# Altium footprint library Library 3D.PcbLib: 288 footprints (part 10 of 18)
Each footprint in its own frame and in the unit in brackets; x right, y up, seen from the top. Pads: shape width x height; smd on the part's side, far side on the other; paste and mask are expansions set on the pad; w line width, h text height; cw(c..) or ccw(c..) is an arc to the next point about the centre after c.
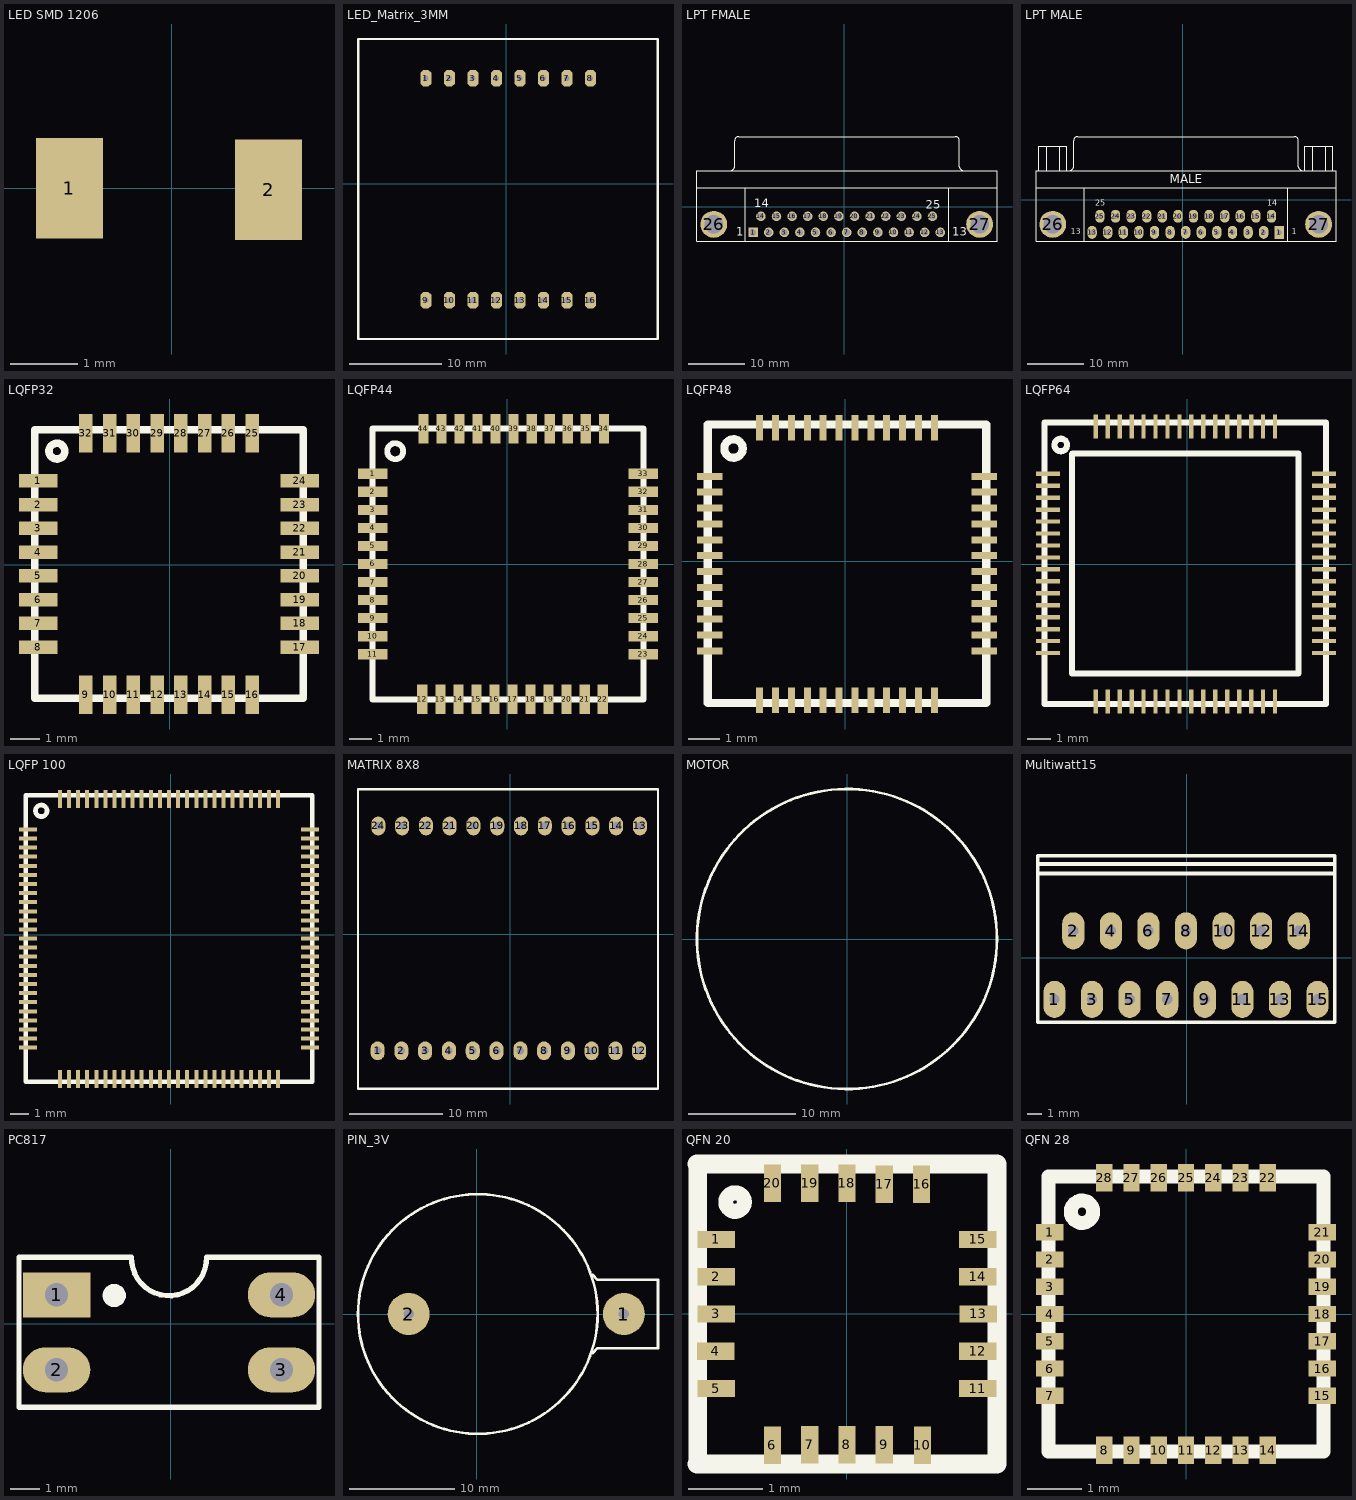
[diagram p9: the footprints below, top view; thin cyan lines are the x and y axes]

## LED SMD 1206 [mm]
pads (2):
  rect 1x1.5 smd: 1(-1.524,0) 2(1.448,-0.025)
3D body "SW3dPS-LED1206R.STEP": height 1.11, standoff -0.4, extent -1.753,-0.826 1.448,0.775

## LED_Matrix_3MM [mm]
pads (16):
  oct 1.2x1.8 hole 0.6: 1(-8.7,11.4) 2(-6.16,11.4) 3(-3.62,11.4) 4(-1.08,11.4) 5(1.46,11.4) 6(4,11.4) 7(6.54,11.4) 8(9.08,11.4) 9(-8.7,-12.6) 10(-6.16,-12.6) 11(-3.62,-12.6) 12(-1.08,-12.6) 13(1.46,-12.6) 14(4,-12.6) 15(6.54,-12.6) 16(9.08,-12.6)
Top Overlay:
  lines w0.254: -16,-16.775 -16,15.625 16.35,15.625 16.35,-16.775 -16,-16.775
3D body "Grend.STEP": height 7.2, standoff -7, extent -15.8,-16.6 16.2,15.4

## LPT FMALE [mm]
pads (27):
  rect 1.69x1.69 hole 1.09: 1(-16.091,-4.545)
  round 1.69 hole 1.09: 2(-13.33,-4.545) 3(-10.569,-4.545) 4(-7.808,-4.545) 5(-5.047,-4.545) 6(-2.286,-4.545) 7(0.475,-4.545) 8(3.236,-4.545) 9(5.997,-4.545) 10(8.758,-4.545) 11(11.519,-4.545) 12(14.28,-4.545) 13(17.041,-4.545) 14(-14.71,-1.705) 15(-11.949,-1.705) 16(-9.188,-1.705) 17(-6.427,-1.705) 18(-3.666,-1.705) 19(-0.905,-1.705) 20(1.856,-1.705) 21(4.617,-1.705) 22(7.378,-1.705) 23(10.139,-1.705) 24(12.9,-1.705) 25(15.661,-1.705)
  round 4.76 hole 3.26: 26(-23.051,-3.125) 27(24.001,-3.125)
Top Overlay:
  lines w0.2: -26.021,3.375 27.079,3.375 ; -20.066,6.38 ccw(c-20.066,7.075) -19.371,7.075 -19.371,11.675 ; -19.366,11.68 cw(c-18.671,11.68) -18.671,12.375 19.729,12.375 cw(c19.729,11.68) 20.424,11.68 ; -17.471,-6.125 -17.471,3.375 ; 18.529,-6.125 18.529,3.375 ; 20.429,11.675 20.429,7.075 ccw(c21.124,7.075) 21.124,6.38 ; -26.021,-6.125 27.079,-6.125 27.079,6.375 -26.021,6.375 -26.021,-6.125
  text "1" at -19.083,-5.182 h1.5
  text "13" at 19.144,-5.182 h1.5
  text "14" at -15.908,-0.102 h1.5
  text "25" at 14.445,-0.356 h1.5
3D body "SW3dPS-d-sub25 connector.STEP": height 12.57, standoff -4.58, extent -26.017,-6.122 27.023,14.378

## LPT MALE [mil]
pads (27):
  rect 65x90 hole 35: 1(673.86,-228.15)
  oval 65x90 hole 35: 2(565.16,-228.15) 3(456.46,-228.15) 4(347.76,-228.15) 5(239.06,-228.15) 6(130.35,-228.15) 7(21.65,-228.15) 8(-87.05,-228.15) 9(-195.75,-228.15) 10(-304.45,-228.15) 11(-413.15,-228.15) 12(-521.85,-228.15) 13(-630.55,-228.15) 14(619.51,-116.34) 15(510.81,-116.34) 16(402.11,-116.34) 17(293.41,-116.34) 18(184.7,-116.34) 19(76,-116.34) 20(-32.7,-116.34) 21(-141.4,-116.34) 22(-250.1,-116.34) 23(-358.8,-116.34) 24(-467.5,-116.34) 25(-576.2,-116.34)
  round 187.4 hole 128.35: 26(-904.57,-172.24) 27(947.87,-172.24)
Top Overlay:
  lines w7.87: -1021.5,83.66 1069.05,83.66 ; -787.05,201.97 ccw(c-787.05,229.33) -759.69,229.33 -759.69,410.43 ; -759.49,410.63 cw(c-732.13,410.63) -732.13,437.99 779.68,437.99 cw(c779.68,410.63) 807.05,410.63 ; -684.88,-290.35 -684.88,83.66 ; 732.44,-290.35 732.44,83.66 ; 807.24,410.43 807.24,229.33 ccw(c834.61,229.33) 834.61,201.97 ; -1021.5,-290.35 -1021.5,201.77 1069.05,201.77 1069.05,-290.35 -1021.5,-290.35
  lines w8: -1001.35,202.77 -1001.35,371.77 -806.35,371.77 -806.35,202.77 ; -946.35,202.77 -946.35,371.77 ; -856.35,202.77 -856.35,371.77 ; 851.65,202.77 851.65,371.77 1046.65,371.77 1046.65,202.77 ; 906.65,202.77 906.65,371.77 ; 996.65,202.77 996.65,371.77
  text "25" at -608.35,-43.23 h40
  text "14" at 591.65,-43.23 h40
  text "13" at -778.35,-243.23 h40
  text "1" at 761.65,-243.23 h40
  text "MALE" at -88.35,112.76 h60
3D body "SW3DPS-DB25RA_M-DEFAULT.STEP": height 500.6, standoff -176.56, extent -1030.9,-290.24 1074.21,434.17

## LQFP32 [mm]
pads (32):
  rect 1.3x0.45 smd: 1(-4.425,2.825) 2(-4.425,2.025) 3(-4.425,1.225) 4(-4.425,0.425) 5(-4.425,-0.375) 6(-4.425,-1.175) 7(-4.425,-1.975) 8(-4.425,-2.775) 17(4.375,-2.775) 18(4.375,-1.975) 19(4.375,-1.175) 20(4.375,-0.375) 21(4.375,0.425) 22(4.375,1.225) 23(4.375,2.025) 24(4.375,2.825)
  rect 0.45x1.3 smd: 9(-2.825,-4.375) 10(-2.025,-4.375) 11(-1.225,-4.375) 12(-0.425,-4.375) 13(0.375,-4.375) 14(1.175,-4.375) 15(1.975,-4.375) 16(2.775,-4.375) 25(2.775,4.425) 26(1.975,4.425) 27(1.175,4.425) 28(0.375,4.425) 29(-0.425,4.425) 30(-1.225,4.425) 31(-2.025,4.425) 32(-2.825,4.425)
Top Overlay:
  circle w0.254: c-3.8,3.825 r0.266
  lines w0.254: -4.544,-4.494 4.494,-4.494 4.494,4.544 -4.544,4.544 -4.544,-4.494
3D body "User Library-LQFP32-0_8.STEP": height 1.65, standoff -0.01, extent -4.569,-4.494 4.469,4.544

## LQFP44 [mm]
pads (44):
  rect 1.3x0.45 smd: 1(-5.975,4) 2(-5.975,3.2) 3(-5.975,2.4) 4(-5.975,1.6) 5(-5.975,0.8) 6(-5.975,0) 7(-5.975,-0.8) 8(-5.975,-1.6) 9(-5.975,-2.4) 10(-5.975,-3.2) 11(-5.975,-4) 23(6.025,-4) 24(6.025,-3.2) 25(6.025,-2.4) 26(6.025,-1.6) 27(6.025,-0.8) 28(6.025,0) 29(6.025,0.8) 30(6.025,1.6) 31(6.025,2.4) 32(6.025,3.2) 33(6.025,4)
  rect 0.45x1.3 smd: 12(-3.775,-6) 13(-2.975,-6) 14(-2.175,-6) 15(-1.375,-6) 16(-0.575,-6) 17(0.225,-6) 18(1.025,-6) 19(1.825,-6) 20(2.625,-6) 21(3.425,-6) 22(4.225,-6) 34(4.275,6) 35(3.475,6) 36(2.675,6) 37(1.875,6) 38(1.075,6) 39(0.275,6) 40(-0.525,6) 41(-1.325,6) 42(-2.125,6) 43(-2.925,6) 44(-3.725,6)
Top Overlay:
  circle w0.254: c-4.975,5 r0.354
  lines w0.254: -5.987,-6.012 -5.987,6.012 6.037,6.012 6.037,-6.012 -5.987,-6.012
3D body "SW3dPS-LQFP44.STEP": height 1.4, standoff 0, extent -5.987,-6.012 6.037,6.012

## LQFP48 [mm]
pads (48):
  rect 0.8x0.22 smd: 1(-4.275,2.675) 2(-4.275,2.175) 3(-4.275,1.675) 4(-4.275,1.175) 5(-4.275,0.675) 6(-4.275,0.175) 7(-4.275,-0.325) 8(-4.275,-0.825) 9(-4.275,-1.325) 10(-4.275,-1.825) 11(-4.275,-2.325) 12(-4.275,-2.825) 25(4.375,-2.825) 26(4.375,-2.325) 27(4.375,-1.825) 28(4.375,-1.325) 29(4.375,-0.825) 30(4.375,-0.325) 31(4.375,0.175) 32(4.375,0.675) 33(4.375,1.175) 34(4.375,1.675) 35(4.375,2.175) 36(4.375,2.675)
  rect 0.22x0.8 smd: 13(-2.7,-4.375) 14(-2.2,-4.375) 15(-1.7,-4.375) 16(-1.2,-4.375) 17(-0.7,-4.375) 18(-0.2,-4.375) 19(0.3,-4.375) 20(0.8,-4.375) 21(1.3,-4.375) 22(1.8,-4.375) 23(2.3,-4.375) 24(2.8,-4.375) 37(2.8,4.2) 38(2.3,4.2) 39(1.8,4.2) 40(1.3,4.2) 41(0.8,4.2) 42(0.3,4.2) 43(-0.2,4.2) 44(-0.7,4.2) 45(-1.2,4.2) 46(-1.7,4.2) 47(-2.2,4.2) 48(-2.7,4.2)
Top Overlay:
  circle w0.254: c-3.525,3.55 r0.292
  lines w0.254: -4.336,-4.461 -4.336,4.311 4.436,4.311 4.436,-4.461 -4.336,-4.461
3D body "User Library-LQFP48-0_5.STEP": height 1.55, standoff -0.02, extent -4.336,-4.461 4.436,4.311

## LQFP64 [mm]
pads (64):
  rect 1x0.18 smd: 1(-5.825,3.775) 2(-5.825,3.275) 3(-5.825,2.775) 4(-5.825,2.275) 5(-5.825,1.775) 6(-5.825,1.275) 7(-5.825,0.775) 8(-5.825,0.275) 9(-5.825,-0.225) 10(-5.825,-0.725) 11(-5.825,-1.225) 12(-5.825,-1.725) 13(-5.825,-2.225) 14(-5.825,-2.725) 15(-5.825,-3.225) 16(-5.825,-3.725) 33(5.725,-3.725) 34(5.725,-3.225) 35(5.725,-2.725) 36(5.725,-2.225) 37(5.725,-1.725) 38(5.725,-1.225) 39(5.725,-0.725) 40(5.725,-0.225) 41(5.725,0.275) 42(5.725,0.775) 43(5.725,1.275) 44(5.725,1.775) 45(5.725,2.275) 46(5.725,2.775) 47(5.725,3.275) 48(5.725,3.775)
  rect 0.18x1 smd: 17(-3.825,-5.75) 18(-3.325,-5.75) 19(-2.825,-5.75) 20(-2.325,-5.75) 21(-1.825,-5.75) 22(-1.325,-5.75) 23(-0.825,-5.75) 24(-0.325,-5.75) 25(0.175,-5.75) 26(0.675,-5.75) 27(1.175,-5.75) 28(1.675,-5.75) 29(2.175,-5.75) 30(2.675,-5.75) 31(3.175,-5.75) 32(3.675,-5.75) 49(3.675,5.75) 50(3.175,5.75) 51(2.675,5.75) 52(2.175,5.75) 53(1.675,5.75) 54(1.175,5.75) 55(0.675,5.75) 56(0.175,5.75) 57(-0.325,5.75) 58(-0.825,5.75) 59(-1.325,5.75) 60(-1.825,5.75) 61(-2.325,5.75) 62(-2.825,5.75) 63(-3.325,5.75) 64(-3.825,5.75)
Top Overlay:
  lines w0.254: -5.025,4.975 cw(c-5.288,4.978) -5.026,4.996 ; -4.825,3.95 -4.825,4.6 -4.8,4.625 4.65,4.625 4.65,-4.575 -4.825,-4.575 -4.825,4.375 ; -5.961,-5.861 -5.961,5.911 5.811,5.911 5.811,-5.861 -5.961,-5.861
3D body "User Library-LQFP64-0_5.STEP": height 1.56, standoff -0.01, extent -5.961,-5.861 5.811,5.911

## LQFP 100 [mm]
pads (100):
  rect 1x0.22 smd: 1(-7.85,5.8) 2(-7.85,5.3) 3(-7.85,4.8) 4(-7.85,4.3) 5(-7.85,3.8) 6(-7.85,3.3) 7(-7.85,2.8) 8(-7.85,2.3) 9(-7.85,1.8) 10(-7.85,1.3) 11(-7.85,0.8) 12(-7.85,0.3) 13(-7.85,-0.2) 14(-7.85,-0.7) 15(-7.85,-1.2) 16(-7.85,-1.7) 17(-7.85,-2.2) 18(-7.85,-2.7) 19(-7.85,-3.2) 20(-7.85,-3.7) 21(-7.85,-4.2) 22(-7.85,-4.7) 23(-7.85,-5.2) 24(-7.85,-5.7) 25(-7.85,-6.2) 51(7.65,-6.2) 52(7.65,-5.7) 53(7.65,-5.2) 54(7.65,-4.7) 55(7.65,-4.2) 56(7.65,-3.7) 57(7.65,-3.2) 58(7.65,-2.7) 59(7.65,-2.2) 60(7.65,-1.7) 61(7.65,-1.2) 62(7.65,-0.7) 63(7.65,-0.2) 64(7.65,0.3) 65(7.65,0.8) 66(7.65,1.3) 67(7.65,1.8) 68(7.65,2.3) 69(7.65,2.8) 70(7.65,3.3) 71(7.65,3.8) 72(7.65,4.3) 73(7.65,4.8) 74(7.65,5.3) 75(7.65,5.8)
  rect 0.22x1 smd: 26(-6.1,-7.925) 27(-5.6,-7.925) 28(-5.1,-7.925) 29(-4.6,-7.925) 30(-4.1,-7.925) 31(-3.6,-7.925) 32(-3.1,-7.925) 33(-2.6,-7.925) 34(-2.1,-7.925) 35(-1.6,-7.925) 36(-1.1,-7.925) 37(-0.6,-7.925) 38(-0.1,-7.925) 39(0.4,-7.925) 40(0.9,-7.925) 41(1.4,-7.925) 42(1.9,-7.925) 43(2.4,-7.925) 44(2.9,-7.925) 45(3.4,-7.925) 46(3.9,-7.925) 47(4.4,-7.925) 48(4.9,-7.925) 49(5.4,-7.925) 50(5.9,-7.925) 76(5.9,7.475) 77(5.4,7.475) 78(4.9,7.475) 79(4.4,7.475) 80(3.9,7.475) 81(3.4,7.475) 82(2.9,7.475) 83(2.4,7.475) 84(1.9,7.475) 85(1.4,7.475) 86(0.9,7.475) 87(0.4,7.475) 88(-0.1,7.475) 89(-0.6,7.475) 90(-1.1,7.475) 91(-1.6,7.475) 92(-2.1,7.475) 93(-2.6,7.475) 94(-3.1,7.475) 95(-3.6,7.475) 96(-4.1,7.475) 97(-4.6,7.475) 98(-5.1,7.475) 99(-5.6,7.475) 100(-6.1,7.475)
Top Overlay:
  circle w0.254: c-7.125,6.825 r0.318
  lines w0.254: -7.986,-8.086 7.786,-8.086 7.786,7.686 -7.986,7.686 -7.986,-8.086
3D body "User Library-LQFP100-0_5.STEP": height 1.55, standoff -0.02, extent -7.986,-8.086 7.786,7.686

## MATRIX 8X8 [mm]
pads (24):
  oval 1.5x2 hole 0.8: 1(-14.15,-12.45) 2(-11.61,-12.45) 3(-9.07,-12.45) 4(-6.53,-12.45) 5(-3.99,-12.45) 6(-1.45,-12.45) 7(1.09,-12.45) 8(3.63,-12.45) 9(6.17,-12.45) 10(8.71,-12.45) 11(11.25,-12.45) 12(13.79,-12.45) 13(13.865,11.575) 14(11.325,11.575) 15(8.785,11.575) 16(6.245,11.575) 17(3.705,11.575) 18(1.165,11.575) 19(-1.375,11.575) 20(-3.915,11.575) 21(-6.455,11.575) 22(-8.995,11.575) 23(-11.535,11.575) 24(-14.075,11.575)
Top Overlay:
  lines w0.254: -16.25,-16.5 -16.25,15.5 15.8,15.5 15.8,-16.5 -16.25,-16.5
3D body "User Library-Bicolor-LED-Matrix.STEP": height 8, standoff -6, extent -16.175,-16.45 15.825,15.55

## MOTOR [mm]
Top Overlay:
  circle w0.254: c0,0 r14.058
3D body "User Library-Turnigy Motor.STEP": height 51, standoff 0, extent -14,-14 14,14

## Multiwatt15 [mm]
pads (15):
  oval 1.5x2.5 hole 0.7: 1(-8.95,-2.805) 2(-7.68,1.825) 3(-6.41,-2.805) 4(-5.14,1.825) 5(-3.87,-2.805) 6(-2.6,1.825) 7(-1.33,-2.805) 8(-0.06,1.825) 9(1.21,-2.805) 10(2.48,1.825) 11(3.75,-2.805) 12(5.02,1.825) 13(6.29,-2.805) 14(7.56,1.825) 15(8.83,-2.805)
Top Overlay:
  lines w0.254: -10.05,6.35 9.95,6.35 ; -10.025,5.7 10,5.7 ; -10.075,-4.35 10,-4.35 10,6.9 -10.075,6.9 -10.075,-4.35
3D body "TDA7294.STEP": height 21.57, standoff -8.68, extent -9.85,-3.082 9.75,6.65

## PC817 [mil]
pads (4):
  rect 90x60 hole 31: 1(-152.56,38.39)
  oval 90x60 hole 31: 2(-152.56,-61.61) 3(147.44,-61.61) 4(147.44,38.39)
Top Overlay:
  circle w15: c-75.56,37.39 r8
  lines w7: -52.56,88.39 -202.56,88.39 -202.56,-111.61 197.44,-111.61 197.44,88.39 48.44,88.39 ; -52.51,88.76 ccw(c-2.54,87.07) 47.44,88.39
3D body "SW3DPS-DIP4-DEFAULT.STEP": height 169.69, standoff -129.13, extent -162.56,-120.67 152.4,97.44

## PIN_3V [mm]
pads (2):
  round 4 hole 1: 1(14,0) 2(-6.5,0)
Top Overlay:
  circle w0.254: c0.087,0 r11.413
  lines w0.254: 11,-3.75 11.5,-3.25 17.25,-3.25 17.25,3.25 11.5,3.25 11,3.75
3D body "User Library-CR 2032 (Battery Holder)-1.STEP": height 7.05, standoff -3.5, extent -11.375,-11.375 17.325,11.375

## QFN 20 [mm]
pads (20):
  rect 0.5x0.23 smd: 1(-1.75,1) 2(-1.75,0.5) 3(-1.75,0) 4(-1.76,-0.5) 5(-1.75,-1) 11(1.75,-1) 12(1.75,-0.5) 13(1.76,0) 14(1.75,0.5) 15(1.75,1)
  rect 0.23x0.5 smd: 6(-1,-1.76) 7(-0.5,-1.75) 8(0,-1.75) 9(0.5,-1.75) 10(1.01,-1.76) 16(1,1.74) 17(0.5,1.74) 18(0,1.75) 19(-0.5,1.75) 20(-1,1.75)
Top Overlay:
  circle w0.2: c-1.5,1.5 r0.125
  lines w0.254: -2.01,2.01 2.01,2.01 2.01,-2.01 -2.01,-2.01 -2,-2 -2,2.01
3D body "User Library-QFN20_4x4x0_8.STEP": height 0.78, standoff -0.02, extent -2.01,-2.01 2.01,2.01

## QFN 28 [mm]
pads (28):
  rect 0.5x0.3 smd: 1(-2.5,1.5) 2(-2.5,1) 3(-2.5,0.5) 4(-2.5,0) 5(-2.5,-0.5) 6(-2.5,-1) 7(-2.5,-1.5) 15(2.5,-1.5) 16(2.5,-1) 17(2.5,-0.5) 18(2.5,0) 19(2.5,0.5) 20(2.5,1) 21(2.5,1.5)
  rect 0.3x0.5 smd: 8(-1.5,-2.5) 9(-1,-2.5) 10(-0.5,-2.5) 11(0,-2.5) 12(0.5,-2.5) 13(1,-2.5) 14(1.5,-2.5) 22(1.5,2.5) 23(1,2.5) 24(0.5,2.5) 25(0,2.5) 26(-0.5,2.5) 27(-1,2.5) 28(-1.5,2.5)
Top Overlay:
  circle w0.254: c-1.906,1.875 r0.206
  lines w0.254: -2.52,-2.52 2.52,-2.52 2.52,2.52 -2.52,2.52 -2.52,-2.52
3D body "User Library-QFN28.STEP": height 0.9, standoff 0, extent -2.52,-2.52 2.52,2.52